# Altium footprint library Connectors SMD.PcbLib: 130 footprints (part 5 of 12)
Each footprint in its own frame and in the unit in brackets; x right, y up, seen from the top. Pads: shape width x height; smd on the part's side, far side on the other; paste and mask are expansions set on the pad; w line width, h text height; cw(c..) or ccw(c..) is an arc to the next point about the centre after c.
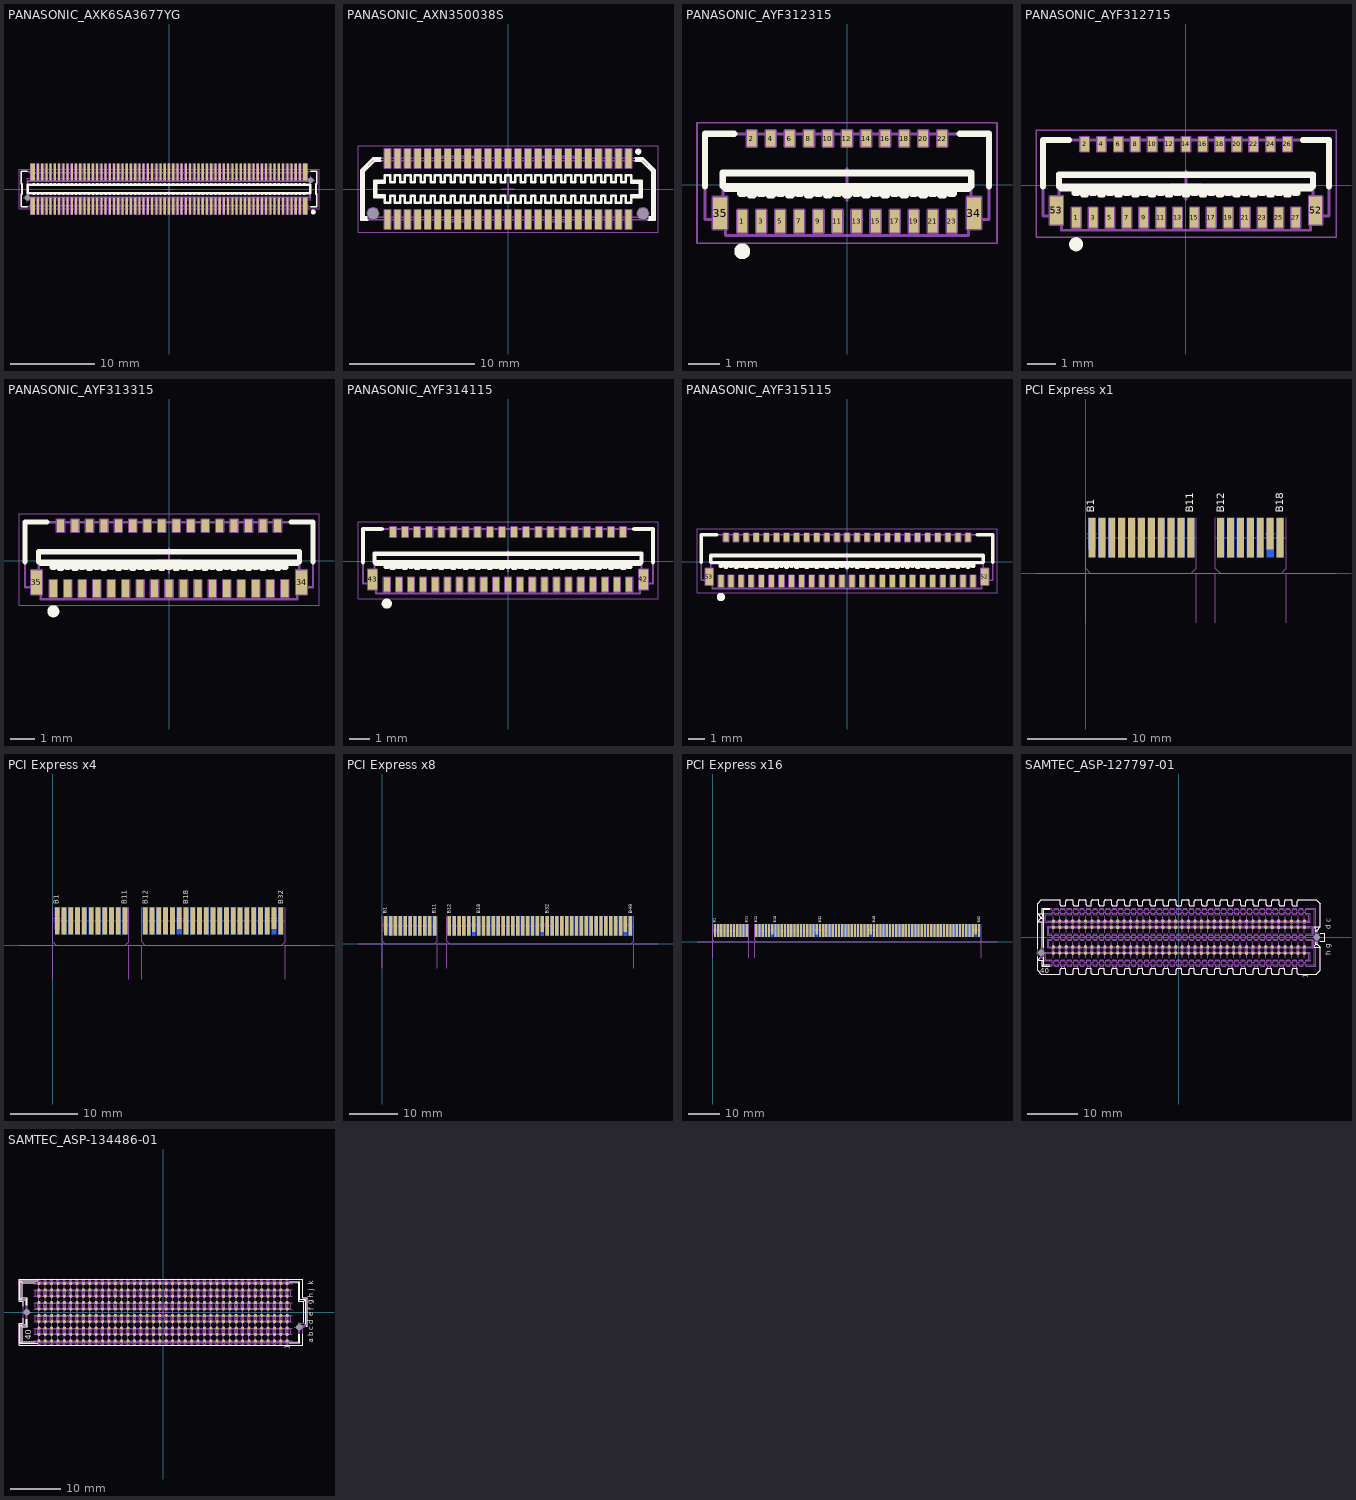
[diagram p4: the footprints below, top view; thin cyan lines are the x and y axes]

## PANASONIC_AXK6SA3677YG [mm] "130 Contacts, Narrow-Pitch 0.5mm, Surface Mount, Straight Board Stacking Header, AXK6S Serie"
height 5.3
pads (132):
  rect 0.5x2 smd: 1(16.125,-2) 2(16.125,2) 129(-16.125,-2) 130(-16.125,2)
  rect 0.25x2 smd: 3(15.5,-2) 4(15.5,2) 5(15,-2) 6(15,2) 7(14.5,-2) 8(14.5,2) 9(14,-2) 10(14,2) 11(13.5,-2) 12(13.5,2) 13(13,-2) 14(13,2) 15(12.5,-2) 16(12.5,2) 17(12,-2) 18(12,2) 19(11.5,-2) 20(11.5,2) 21(11,-2) 22(11,2) 23(10.5,-2) 24(10.5,2) 25(10,-2) 26(10,2) 27(9.5,-2) 28(9.5,2) 29(9,-2) 30(9,2) 31(8.5,-2) 32(8.5,2) 33(8,-2) 34(8,2) 35(7.5,-2) 36(7.5,2) 37(7,-2) 38(7,2) 39(6.5,-2) 40(6.5,2) 41(6,-2) 42(6,2) 43(5.5,-2) 44(5.5,2) 45(5,-2) 46(5,2) 47(4.5,-2) 48(4.5,2) 49(4,-2) 50(4,2) 51(3.5,-2) 52(3.5,2) 53(3,-2) 54(3,2) 55(2.5,-2) 56(2.5,2) 57(2,-2) 58(2,2) 59(1.5,-2) 60(1.5,2) 61(1,-2) 62(1,2) 63(0.5,-2) 64(0.5,2) 65(0,-2) 66(0,2) 67(-0.5,-2) 68(-0.5,2) 69(-1,-2) 70(-1,2) 71(-1.5,-2) 72(-1.5,2) 73(-2,-2) 74(-2,2) 75(-2.5,-2) 76(-2.5,2) 77(-3,-2) 78(-3,2) 79(-3.5,-2) 80(-3.5,2) 81(-4,-2) 82(-4,2) 83(-4.5,-2) 84(-4.5,2) 85(-5,-2) 86(-5,2) 87(-5.5,-2) 88(-5.5,2) 89(-6,-2) 90(-6,2) 91(-6.5,-2) 92(-6.5,2) 93(-7,-2) 94(-7,2) 95(-7.5,-2) 96(-7.5,2) 97(-8,-2) 98(-8,2) 99(-8.5,-2) 100(-8.5,2) 101(-9,-2) 102(-9,2) 103(-9.5,-2) 104(-9.5,2) 105(-10,-2) 106(-10,2) 107(-10.5,-2) 108(-10.5,2) 109(-11,-2) 110(-11,2) 111(-11.5,-2) 112(-11.5,2) 113(-12,-2) 114(-12,2) 115(-12.5,-2) 116(-12.5,2) 117(-13,-2) 118(-13,2) 119(-13.5,-2) 120(-13.5,2) 121(-14,-2) 122(-14,2) 123(-14.5,-2) 124(-14.5,2) 125(-15,-2) 126(-15,2) 127(-15.5,-2) 128(-15.5,2)
  round 0.5 hole 0.65 unplated mask+0.075: 131(-16.75,-1.05) 132(16.75,1.05)
Top Overlay:
  drawing of 418 lines, arcs and shapes, not listed
Mechanical 8:
  drawing of 794 lines, arcs and shapes, not listed
Mechanical 14:
  drawing of 424 lines, arcs and shapes, not listed
Mechanical 15:
  lines w0.1: -17.75,-2.35 -17.75,2.35 17.75,2.35 17.75,-2.35 -17.75,-2.35
3D body: height 5.3, standoff 0, extent -17.5,-2.5 17.5,2.5

## PANASONIC_AXN350038S [mm] "50 Contacts, Narrow-Pitch 0.8mm, Surface Mount, Straight Board Stacking Connector, Socket P8 Serie"
height 2.2
pads (52):
  rect 0.5x1.53 smd: 1(9.6,2.425) 2(9.6,-2.425) 3(8.8,2.425) 4(8.8,-2.425) 5(8,2.425) 6(8,-2.425) 7(7.2,2.425) 8(7.2,-2.425) 9(6.4,2.425) 10(6.4,-2.425) 11(5.6,2.425) 12(5.6,-2.425) 13(4.8,2.425) 14(4.8,-2.425) 15(4,2.425) 16(4,-2.425) 17(3.2,2.425) 18(3.2,-2.425) 19(2.4,2.425) 20(2.4,-2.425) 21(1.6,2.425) 22(1.6,-2.425) 23(0.8,2.425) 24(0.8,-2.425) 25(0,2.425) 26(0,-2.425) 27(-0.8,2.425) 28(-0.8,-2.425) 29(-1.6,2.425) 30(-1.6,-2.425) 31(-2.4,2.425) 32(-2.4,-2.425) 33(-3.2,2.425) 34(-3.2,-2.425) 35(-4,2.425) 36(-4,-2.425) 37(-4.8,2.425) 38(-4.8,-2.425) 39(-5.6,2.425) 40(-5.6,-2.425) 41(-6.4,2.425) 42(-6.4,-2.425) 43(-7.2,2.425) 44(-7.2,-2.425) 45(-8,2.425) 46(-8,-2.425) 47(-8.8,2.425) 48(-8.8,-2.425) 49(-9.6,2.425) 50(-9.6,-2.425)
  round 0.5 hole 0.9 unplated: 51(10.75,-1.95) 52(-10.75,-1.95)
Top Overlay:
  drawing of 237 lines, arcs and shapes, not listed
Mechanical 8:
  drawing of 414 lines, arcs and shapes, not listed
Mechanical 14:
  drawing of 244 lines, arcs and shapes, not listed
Mechanical 15:
  lines w0.05: -11.95,-3.44 -11.95,3.44 11.95,3.44 11.95,-3.44 -11.95,-3.44
3D body: height 2.2, standoff -0.4, extent -11.7,-2.94 11.7,2.94

## PANASONIC_AYF312315 [mm] "23 Contacts, Pitch 0.3mm, Surface Mount, FPC for FPC Connection, YF31 Serie"
height 0.91
pads (25):
  rect 0.3x0.7 smd: 1(-3.3,-1.15) 3(-2.7,-1.15) 5(-2.1,-1.15) 7(-1.5,-1.15) 9(-0.9,-1.15) 11(-0.3,-1.15) 13(0.3,-1.15) 15(0.9,-1.15) 17(1.5,-1.15) 19(2.1,-1.15) 21(2.7,-1.15) 23(3.3,-1.15)
  rect 0.3x0.5 smd: 2(-3,1.45) 4(-2.4,1.45) 6(-1.8,1.45) 8(-1.2,1.45) 10(-0.6,1.45) 12(0,1.45) 14(0.6,1.45) 16(1.2,1.45) 18(1.8,1.45) 20(2.4,1.45) 22(3,1.45)
  rect 0.45x1 smd: 34(4,-0.9) 35(-4,-0.9)
Top Overlay:
  circle w0.25: c-3.3,-2.1 r0.125
  lines w0.2: -4.475,-0.05 -4.475,1.6 -3.55,1.6 ; -3.91,0.35 3.91,0.35 ; -3.825,-0.05 -3.825,-0.129 -3.36,-0.129 ; -3.36,-0.05 -3.36,-0.283 -3.24,-0.283 -3.24,-0.05 ; -3.24,-0.129 -3.06,-0.129 ; -3.06,-0.05 -3.06,-0.332 -2.94,-0.332 -2.94,-0.05 ; -2.94,-0.129 -2.76,-0.129 ; -2.76,-0.05 -2.76,-0.283 -2.64,-0.283 -2.64,-0.05 ; -2.64,-0.129 -2.46,-0.129 ; -2.46,-0.05 -2.46,-0.332 -2.34,-0.332 -2.34,-0.05 ; -2.34,-0.129 -2.16,-0.129 ; -2.16,-0.05 -2.16,-0.283 -2.04,-0.283 -2.04,-0.05 ; -2.04,-0.129 -1.86,-0.129 ; -1.86,-0.05 -1.86,-0.332 -1.74,-0.332 -1.74,-0.05 ; -1.74,-0.129 -1.56,-0.129 ; -1.56,-0.05 -1.56,-0.283 -1.44,-0.283 -1.44,-0.05 ; -1.44,-0.129 -1.26,-0.129 ; -1.26,-0.05 -1.26,-0.332 -1.14,-0.332 -1.14,-0.05 ; -1.14,-0.129 -0.96,-0.129 ; -0.96,-0.05 -0.96,-0.283 -0.84,-0.283 -0.84,-0.05 ; -0.84,-0.129 -0.66,-0.129 ; -0.66,-0.05 -0.66,-0.332 -0.54,-0.332 -0.54,-0.05 ; -0.54,-0.129 -0.36,-0.129 ; -0.36,-0.05 -0.36,-0.283 -0.24,-0.283 -0.24,-0.05 ; -0.24,-0.129 -0.06,-0.129 ; -0.06,-0.05 -0.06,-0.332 0.06,-0.332 0.06,-0.05 ; 0.06,-0.129 0.24,-0.129 ; 0.24,-0.05 0.24,-0.283 0.36,-0.283 0.36,-0.05 ; 0.36,-0.129 0.54,-0.129 ; 0.54,-0.05 0.54,-0.332 0.66,-0.332 0.66,-0.05 ; 0.66,-0.129 0.84,-0.129 ; 0.84,-0.05 0.84,-0.283 0.96,-0.283 0.96,-0.05 ; 0.96,-0.129 1.14,-0.129 ; 1.14,-0.05 1.14,-0.332 1.26,-0.332 1.26,-0.05 ; 1.26,-0.129 1.44,-0.129 ; 1.44,-0.05 1.44,-0.283 1.56,-0.283 1.56,-0.05 ; 1.56,-0.129 1.74,-0.129 ; 1.74,-0.05 1.74,-0.332 1.86,-0.332 1.86,-0.05 ; 1.86,-0.129 2.04,-0.129 ; 2.04,-0.05 2.04,-0.283 2.16,-0.283 2.16,-0.05 ; 2.16,-0.129 2.34,-0.129 ; 2.34,-0.05 2.34,-0.332 2.46,-0.332 2.46,-0.05 ; 2.46,-0.129 2.64,-0.129 ; 2.64,-0.05 2.64,-0.283 2.76,-0.283 2.76,-0.05 ; 2.76,-0.129 2.94,-0.129 ; 2.94,-0.05 2.94,-0.332 3.06,-0.332 3.06,-0.05 ; 3.06,-0.129 3.24,-0.129 ; 3.24,-0.05 3.24,-0.283 3.36,-0.283 3.36,-0.05 ; 3.36,-0.129 3.825,-0.129 3.825,-0.05 ; 3.55,1.6 4.475,1.6 4.475,-0.05 ; -3.91,-0.05 -3.91,0.38 3.91,0.38 3.91,-0.05 -3.91,-0.05
Mechanical 8:
  lines w0.1: -4,-0.9 -4.225,-0.4 ; -3.3,-1.15 -3.15,-1.5 ; -3,1.45 -3.15,1.2 ; -2.7,-1.15 -2.55,-1.5 ; -2.4,1.45 -2.55,1.2 ; -2.1,-1.15 -1.95,-1.5 ; -1.8,1.45 -1.95,1.2 ; -1.5,-1.15 -1.35,-1.5 ; -1.2,1.45 -1.35,1.2 ; -0.9,-1.15 -0.75,-1.5 ; -0.6,1.45 -0.75,1.2 ; -0.5,0 0,0 ; -0.3,-1.15 -0.15,-1.5 ; 0,-0.5 0,0 ; 0,0.5 0,0 ; 0,1.45 -0.15,1.2 ; 0.3,-1.15 0.45,-1.5 ; 0.5,0 0,0 ; 0.6,1.45 0.45,1.2 ; 0.9,-1.15 1.05,-1.5 ; 1.2,1.45 1.05,1.2 ; 1.5,-1.15 1.65,-1.5 ; 1.8,1.45 1.65,1.2 ; 2.1,-1.15 2.25,-1.5 ; 2.4,1.45 2.25,1.2 ; 2.7,-1.15 2.85,-1.5 ; 3,1.45 2.85,1.2 ; 3.3,-1.15 3.45,-1.5 ; 4,-0.9 3.775,-0.4 ; -4.225,-0.4 -3.775,-0.4 -3.775,-1.4 -4.225,-1.4 -4.225,-0.4 ; -3.15,-1.5 -3.45,-1.5 -3.45,-0.8 -3.15,-0.8 -3.15,-1.5 ; -3.15,1.2 -2.85,1.2 -2.85,1.7 -3.15,1.7 -3.15,1.2 ; -2.55,-1.5 -2.85,-1.5 -2.85,-0.8 -2.55,-0.8 -2.55,-1.5 ; -2.55,1.2 -2.25,1.2 -2.25,1.7 -2.55,1.7 -2.55,1.2 ; -1.95,-1.5 -2.25,-1.5 -2.25,-0.8 -1.95,-0.8 -1.95,-1.5 ; -1.95,1.2 -1.65,1.2 -1.65,1.7 -1.95,1.7 -1.95,1.2 ; -1.35,-1.5 -1.65,-1.5 -1.65,-0.8 -1.35,-0.8 -1.35,-1.5 ; -1.35,1.2 -1.05,1.2 -1.05,1.7 -1.35,1.7 -1.35,1.2 ; -0.75,-1.5 -1.05,-1.5 -1.05,-0.8 -0.75,-0.8 -0.75,-1.5 ; -0.75,1.2 -0.45,1.2 -0.45,1.7 -0.75,1.7 -0.75,1.2 ; -0.15,-1.5 -0.45,-1.5 -0.45,-0.8 -0.15,-0.8 -0.15,-1.5 ; -0.15,1.2 0.15,1.2 0.15,1.7 -0.15,1.7 -0.15,1.2 ; 0.45,-1.5 0.15,-1.5 0.15,-0.8 0.45,-0.8 0.45,-1.5 ; 0.45,1.2 0.75,1.2 0.75,1.7 0.45,1.7 0.45,1.2 ; 1.05,-1.5 0.75,-1.5 0.75,-0.8 1.05,-0.8 1.05,-1.5 ; 1.05,1.2 1.35,1.2 1.35,1.7 1.05,1.7 1.05,1.2 ; 1.65,-1.5 1.35,-1.5 1.35,-0.8 1.65,-0.8 1.65,-1.5 ; 1.65,1.2 1.95,1.2 1.95,1.7 1.65,1.7 1.65,1.2 ; 2.25,-1.5 1.95,-1.5 1.95,-0.8 2.25,-0.8 2.25,-1.5 ; 2.25,1.2 2.55,1.2 2.55,1.7 2.25,1.7 2.25,1.2 ; 2.85,-1.5 2.55,-1.5 2.55,-0.8 2.85,-0.8 2.85,-1.5 ; 2.85,1.2 3.15,1.2 3.15,1.7 2.85,1.7 2.85,1.2 ; 3.45,-1.5 3.15,-1.5 3.15,-0.8 3.45,-0.8 3.45,-1.5 ; 3.775,-0.4 4.225,-0.4 4.225,-1.4 3.775,-1.4 3.775,-0.4
Mechanical 14:
  lines w0.1: -4.125,-1.1 -4.125,-1.15 -3.825,-1.15 -3.825,-1.6 3.825,-1.6 3.825,-1.15 4.125,-1.15 4.125,-1.1 ; -4.075,-1.15 -4.075,-1.25 -3.925,-1.25 -3.925,-1.15 ; -3.91,-1.15 -3.91,-1.17 ; -3.91,-0.151 -3.825,-0.151 -3.825,-0.129 ; -3.91,-0.15 -3.825,-0.15 ; -3.91,-0.13 -3.825,-0.13 ; -3.91,-0.05 3.91,-0.05 ; -3.91,0.35 3.91,0.35 ; -3.825,-1.385 -3.91,-1.3 ; -3.825,-1.3 -3.91,-1.3 ; -3.825,-1.17 -3.91,-1.17 ; -3.825,-0.05 -3.825,-0.129 ; -3.36,-0.129 -3.825,-0.129 ; -3.36,-0.05 -3.36,-0.283 -3.24,-0.283 -3.24,-0.05 ; -3.24,-0.129 -3.06,-0.129 ; -3.06,-0.05 -3.06,-0.332 -2.94,-0.332 -2.94,-0.05 ; -2.94,-0.129 -2.76,-0.129 ; -2.76,-0.05 -2.76,-0.283 -2.64,-0.283 -2.64,-0.05 ; -2.64,-0.129 -2.46,-0.129 ; -2.46,-0.05 -2.46,-0.332 -2.34,-0.332 -2.34,-0.05 ; -2.34,-0.129 -2.16,-0.129 ; -2.16,-0.05 -2.16,-0.283 -2.04,-0.283 -2.04,-0.05 ; -2.04,-0.129 -1.86,-0.129 ; -1.86,-0.05 -1.86,-0.332 -1.74,-0.332 -1.74,-0.05 ; -1.74,-0.129 -1.56,-0.129 ; -1.56,-0.05 -1.56,-0.283 -1.44,-0.283 -1.44,-0.05 ; -1.44,-0.129 -1.26,-0.129 ; -1.26,-0.05 -1.26,-0.332 -1.14,-0.332 -1.14,-0.05 ; -1.14,-0.129 -0.96,-0.129 ; -0.96,-0.05 -0.96,-0.283 -0.84,-0.283 -0.84,-0.05 ; -0.84,-0.129 -0.66,-0.129 ; -0.66,-0.05 -0.66,-0.332 -0.54,-0.332 -0.54,-0.05 ; -0.54,-0.129 -0.36,-0.129 ; -0.36,-0.05 -0.36,-0.283 -0.24,-0.283 -0.24,-0.05 ; -0.24,-0.129 -0.06,-0.129 ; -0.06,-0.05 -0.06,-0.332 0.06,-0.332 0.06,-0.05 ; 0.06,-0.129 0.24,-0.129 ; 0.24,-0.05 0.24,-0.283 0.36,-0.283 0.36,-0.05 ; 0.36,-0.129 0.54,-0.129 ; 0.54,-0.05 0.54,-0.332 0.66,-0.332 0.66,-0.05 ; 0.66,-0.129 0.84,-0.129 ; 0.84,-0.05 0.84,-0.283 0.96,-0.283 0.96,-0.05 ; 0.96,-0.129 1.14,-0.129 ; 1.14,-0.05 1.14,-0.332 1.26,-0.332 1.26,-0.05 ; 1.26,-0.129 1.44,-0.129 ; 1.44,-0.05 1.44,-0.283 1.56,-0.283 1.56,-0.05 ; 1.56,-0.129 1.74,-0.129 ; 1.74,-0.05 1.74,-0.332 1.86,-0.332 1.86,-0.05 ; 1.86,-0.129 2.04,-0.129 ; 2.04,-0.05 2.04,-0.283 2.16,-0.283 2.16,-0.05 ; 2.16,-0.129 2.34,-0.129 ; 2.34,-0.05 2.34,-0.332 2.46,-0.332 2.46,-0.05 ; 2.46,-0.129 2.64,-0.129 ; 2.64,-0.05 2.64,-0.283 2.76,-0.283 2.76,-0.05 ; 2.76,-0.129 2.94,-0.129 ; 2.94,-0.05 2.94,-0.332 3.06,-0.332 3.06,-0.05 ; 3.06,-0.129 3.24,-0.129 ; 3.24,-0.05 3.24,-0.283 3.36,-0.283 3.36,-0.05 ; 3.36,-0.129 3.825,-0.129 ; 3.825,-1.385 3.91,-1.3 ; 3.825,-1.3 3.91,-1.3 ; 3.825,-1.17 3.91,-1.17 ; 3.825,-0.15 3.91,-0.15 ; 3.825,-0.13 3.91,-0.13 ; 3.825,-0.05 3.825,-0.129 ; 3.91,-1.15 3.91,-1.17 ; 3.91,-0.151 3.825,-0.151 3.825,-0.129 ; 3.925,-1.15 3.925,-1.25 4.075,-1.25 4.075,-1.15 ; -3.91,-1.3 -3.91,-1.17 ; 3.91,-1.3 3.91,-1.17 ; -4.475,-1.1 -3.91,-1.1 -3.91,0.38 3.91,0.38 3.91,-1.1 4.475,-1.1 4.475,1.6 -4.475,1.6 -4.475,-1.1
Mechanical 15:
  lines w0.05: -4.725,-1.85 4.725,-1.85 4.725,1.95 -4.725,1.95 -4.725,-1.85
3D body: height 0.9, standoff 0, extent -4.475,-1.6 4.475,1.6

## PANASONIC_AYF312715 [mm] "27 Contacts, Pitch 0.3mm, Surface Mount, FPC for FPC Connection, YF31 Serie"
height 0.91
pads (29):
  rect 0.3x0.7 smd: 1(-3.9,-1.15) 3(-3.3,-1.15) 5(-2.7,-1.15) 7(-2.1,-1.15) 9(-1.5,-1.15) 11(-0.9,-1.15) 13(-0.3,-1.15) 15(0.3,-1.15) 17(0.9,-1.15) 19(1.5,-1.15) 21(2.1,-1.15) 23(2.7,-1.15) 25(3.3,-1.15) 27(3.9,-1.15)
  rect 0.3x0.5 smd: 2(-3.6,1.45) 4(-3,1.45) 6(-2.4,1.45) 8(-1.8,1.45) 10(-1.2,1.45) 12(-0.6,1.45) 14(0,1.45) 16(0.6,1.45) 18(1.2,1.45) 20(1.8,1.45) 22(2.4,1.45) 24(3,1.45) 26(3.6,1.45)
  rect 0.45x1 smd: 52(4.6,-0.9) 53(-4.6,-0.9)
Top Overlay:
  circle w0.25: c-3.9,-2.1 r0.125
  lines w0.2: -5.075,-0.05 -5.075,1.6 -4.15,1.6 ; -4.51,0.35 4.51,0.35 ; -4.425,-0.05 -4.425,-0.129 -3.96,-0.129 ; -3.96,-0.05 -3.96,-0.283 -3.84,-0.283 -3.84,-0.05 ; -3.84,-0.129 -3.66,-0.129 ; -3.66,-0.05 -3.66,-0.332 -3.54,-0.332 -3.54,-0.05 ; -3.36,-0.05 -3.36,-0.283 -3.24,-0.283 -3.24,-0.05 ; -3.24,-0.129 -3.06,-0.129 -3.225,-0.129 ; -3.06,-0.05 -3.06,-0.332 -2.94,-0.332 -2.94,-0.05 ; -2.94,-0.129 -2.76,-0.129 ; -2.76,-0.05 -2.76,-0.283 -2.64,-0.283 -2.64,-0.05 ; -2.64,-0.129 -2.46,-0.129 ; -2.46,-0.05 -2.46,-0.332 -2.34,-0.332 -2.34,-0.05 ; -2.34,-0.129 -2.16,-0.129 ; -2.16,-0.05 -2.16,-0.283 -2.04,-0.283 -2.04,-0.05 ; -2.04,-0.129 -1.86,-0.129 ; -1.86,-0.05 -1.86,-0.332 -1.74,-0.332 -1.74,-0.05 ; -1.74,-0.129 -1.56,-0.129 ; -1.56,-0.05 -1.56,-0.283 -1.44,-0.283 -1.44,-0.05 ; -1.44,-0.129 -1.26,-0.129 ; -1.26,-0.05 -1.26,-0.332 -1.14,-0.332 -1.14,-0.05 ; -1.14,-0.129 -0.96,-0.129 ; -0.96,-0.05 -0.96,-0.283 -0.84,-0.283 -0.84,-0.05 ; -0.84,-0.129 -0.66,-0.129 ; -0.66,-0.05 -0.66,-0.332 -0.54,-0.332 -0.54,-0.05 ; -0.54,-0.129 -0.36,-0.129 ; -0.36,-0.05 -0.36,-0.283 -0.24,-0.283 -0.24,-0.05 ; -0.24,-0.129 -0.06,-0.129 ; -0.06,-0.05 -0.06,-0.332 0.06,-0.332 0.06,-0.05 ; 0.06,-0.129 0.24,-0.129 ; 0.24,-0.05 0.24,-0.283 0.36,-0.283 0.36,-0.05 ; 0.36,-0.129 0.54,-0.129 ; 0.54,-0.05 0.54,-0.332 0.66,-0.332 0.66,-0.05 ; 0.66,-0.129 0.84,-0.129 ; 0.84,-0.05 0.84,-0.283 0.96,-0.283 0.96,-0.05 ; 0.96,-0.129 1.14,-0.129 ; 1.14,-0.05 1.14,-0.332 1.26,-0.332 1.26,-0.05 ; 1.26,-0.129 1.44,-0.129 ; 1.44,-0.05 1.44,-0.283 1.56,-0.283 1.56,-0.05 ; 1.56,-0.129 1.74,-0.129 ; 1.74,-0.05 1.74,-0.332 1.86,-0.332 1.86,-0.05 ; 1.86,-0.129 2.04,-0.129 ; 2.04,-0.05 2.04,-0.283 2.16,-0.283 2.16,-0.05 ; 2.16,-0.129 2.34,-0.129 ; 2.34,-0.05 2.34,-0.332 2.46,-0.332 2.46,-0.05 ; 2.46,-0.129 2.64,-0.129 ; 2.64,-0.05 2.64,-0.283 2.76,-0.283 2.76,-0.05 ; 2.76,-0.129 2.94,-0.129 ; 2.94,-0.05 2.94,-0.332 3.06,-0.332 3.06,-0.05 ; 3.06,-0.129 3.24,-0.129 ; 3.24,-0.05 3.24,-0.283 3.36,-0.283 3.36,-0.05 ; 3.36,-0.129 3.54,-0.129 ; 3.54,-0.05 3.54,-0.332 3.66,-0.332 3.66,-0.05 ; 3.66,-0.129 3.84,-0.129 ; 3.84,-0.05 3.84,-0.283 3.96,-0.283 3.96,-0.05 ; 3.96,-0.129 4.425,-0.129 4.425,-0.05 ; 4.15,1.6 5.075,1.6 5.075,-0.05 ; -4.51,-0.05 4.51,-0.05 4.51,0.38 -4.51,0.38 -4.51,-0.05
Mechanical 8:
  drawing of 151 lines, arcs and shapes, not listed
Mechanical 14:
  drawing of 154 lines, arcs and shapes, not listed
Mechanical 15:
  lines w0.05: -5.325,-1.85 -5.325,1.95 5.325,1.95 5.325,-1.85 -5.325,-1.85
3D body: height 0.9, standoff 0, extent -5.075,-1.6 5.075,1.6

## PANASONIC_AYF313315 [mm] "33 Contacts, Pitch 0.3mm, Surface Mount, FPC for FPC Connection, YF31 Serie"
height 0.91
pads (35):
  rect 0.3x0.7 smd: 1(-4.8,-1.15) 3(-4.2,-1.15) 5(-3.6,-1.15) 7(-3,-1.15) 9(-2.4,-1.15) 11(-1.8,-1.15) 13(-1.2,-1.15) 15(-0.6,-1.15) 17(0,-1.15) 19(0.6,-1.15) 21(1.2,-1.15) 23(1.8,-1.15) 25(2.4,-1.15) 27(3,-1.15) 29(3.6,-1.15) 31(4.2,-1.15) 33(4.8,-1.15)
  rect 0.3x0.5 smd: 2(-4.5,1.45) 4(-3.9,1.45) 6(-3.3,1.45) 8(-2.7,1.45) 10(-2.1,1.45) 12(-1.5,1.45) 14(-0.9,1.45) 16(-0.3,1.45) 18(0.3,1.45) 20(0.9,1.45) 22(1.5,1.45) 24(2.1,1.45) 26(2.7,1.45) 28(3.3,1.45) 30(3.9,1.45) 32(4.5,1.45)
  rect 0.45x1 smd: 34(5.5,-0.9) 35(-5.5,-0.9)
Top Overlay:
  circle w0.25: c-4.8,-2.1 r0.125
  lines w0.2: -5.975,-0.05 -5.975,1.6 -5.05,1.6 ; -5.41,0.35 5.41,0.35 ; -5.325,-0.05 -5.325,-0.129 -4.86,-0.129 ; -4.86,-0.05 -4.86,-0.283 -4.74,-0.283 -4.74,-0.05 ; -4.74,-0.129 -4.56,-0.129 ; -4.56,-0.05 -4.56,-0.332 -4.44,-0.332 -4.44,-0.05 ; -4.44,-0.129 -4.26,-0.129 ; -4.26,-0.05 -4.26,-0.283 -4.14,-0.283 -4.14,-0.05 ; -4.14,-0.129 -3.96,-0.129 ; -3.96,-0.05 -3.96,-0.332 -3.84,-0.332 -3.84,-0.05 ; -3.84,-0.129 -3.66,-0.129 ; -3.66,-0.05 -3.66,-0.283 -3.54,-0.283 -3.54,-0.05 ; -3.54,-0.129 -3.36,-0.129 ; -3.36,-0.05 -3.36,-0.332 -3.24,-0.332 -3.24,-0.05 ; -3.24,-0.129 -3.06,-0.129 ; -3.06,-0.05 -3.06,-0.283 -2.94,-0.283 -2.94,-0.05 ; -2.94,-0.129 -2.76,-0.129 ; -2.76,-0.05 -2.76,-0.332 -2.64,-0.332 -2.64,-0.05 ; -2.64,-0.129 -2.46,-0.129 ; -2.46,-0.05 -2.46,-0.283 -2.34,-0.283 -2.34,-0.05 ; -2.34,-0.129 -2.16,-0.129 ; -2.16,-0.05 -2.16,-0.332 -2.04,-0.332 -2.04,-0.05 ; -2.04,-0.129 -1.86,-0.129 ; -1.86,-0.05 -1.86,-0.283 -1.74,-0.283 -1.74,-0.05 ; -1.74,-0.129 -1.56,-0.129 ; -1.56,-0.05 -1.56,-0.332 -1.44,-0.332 -1.44,-0.05 ; -1.44,-0.129 -1.26,-0.129 ; -1.26,-0.05 -1.26,-0.283 -1.14,-0.283 -1.14,-0.05 ; -1.14,-0.129 -0.96,-0.129 ; -0.96,-0.05 -0.96,-0.332 -0.84,-0.332 -0.84,-0.05 ; -0.84,-0.129 -0.66,-0.129 ; -0.66,-0.05 -0.66,-0.283 -0.54,-0.283 -0.54,-0.05 ; -0.54,-0.129 -0.36,-0.129 ; -0.36,-0.05 -0.36,-0.332 -0.24,-0.332 -0.24,-0.05 ; -0.24,-0.129 -0.06,-0.129 ; -0.06,-0.05 -0.06,-0.283 0.06,-0.283 0.06,-0.05 ; 0.06,-0.129 0.24,-0.129 ; 0.24,-0.05 0.24,-0.332 0.36,-0.332 0.36,-0.05 ; 0.36,-0.129 0.54,-0.129 ; 0.54,-0.05 0.54,-0.283 0.66,-0.283 0.66,-0.05 ; 0.66,-0.129 0.84,-0.129 ; 0.84,-0.05 0.84,-0.332 0.96,-0.332 0.96,-0.05 ; 0.96,-0.129 1.14,-0.129 ; 1.14,-0.05 1.14,-0.283 1.26,-0.283 1.26,-0.05 ; 1.26,-0.129 1.44,-0.129 ; 1.44,-0.05 1.44,-0.332 1.56,-0.332 1.56,-0.05 ; 1.56,-0.129 1.74,-0.129 ; 1.74,-0.05 1.74,-0.283 1.86,-0.283 1.86,-0.05 ; 1.86,-0.129 2.04,-0.129 ; 2.04,-0.05 2.04,-0.332 2.16,-0.332 2.16,-0.05 ; 2.16,-0.129 2.34,-0.129 ; 2.34,-0.05 2.34,-0.283 2.46,-0.283 2.46,-0.05 ; 2.46,-0.129 2.64,-0.129 ; 2.64,-0.05 2.64,-0.332 2.76,-0.332 2.76,-0.05 ; 2.76,-0.129 2.94,-0.129 ; 2.94,-0.05 2.94,-0.283 3.06,-0.283 3.06,-0.05 ; 3.06,-0.129 3.24,-0.129 ; 3.24,-0.05 3.24,-0.332 3.36,-0.332 3.36,-0.05 ; 3.36,-0.129 3.54,-0.129 ; 3.54,-0.05 3.54,-0.283 3.66,-0.283 3.66,-0.05 ; 3.66,-0.129 3.84,-0.129 ; 3.84,-0.05 3.84,-0.332 3.96,-0.332 3.96,-0.05 ; 3.96,-0.129 4.14,-0.129 ; 4.14,-0.05 4.14,-0.283 4.26,-0.283 4.26,-0.05 ; 4.26,-0.129 4.44,-0.129 ; 4.44,-0.05 4.44,-0.332 4.56,-0.332 4.56,-0.05 ; 4.56,-0.129 4.74,-0.129 ; 4.74,-0.05 4.74,-0.283 4.86,-0.283 4.86,-0.05 ; 4.86,-0.129 5.325,-0.129 5.325,-0.05 ; 5.05,1.6 5.975,1.6 5.975,-0.05 ; -5.41,-0.05 5.41,-0.05 5.41,0.38 -5.41,0.38 -5.41,-0.05
Mechanical 8:
  drawing of 179 lines, arcs and shapes, not listed
Mechanical 14:
  drawing of 176 lines, arcs and shapes, not listed
Mechanical 15:
  lines w0.05: -6.225,-1.85 -6.225,1.95 6.225,1.95 6.225,-1.85 -6.225,-1.85
3D body: height 0.9, standoff 0, extent -5.975,-1.6 5.975,1.6

## PANASONIC_AYF314115 [mm] "41 Contacts, Pitch 0.3mm, Surface Mount, FPC for FPC Connection, YF31 Serie"
height 0.91
pads (43):
  rect 0.3x0.7 smd: 1(-6,-1.15) 3(-5.4,-1.15) 5(-4.8,-1.15) 7(-4.2,-1.15) 9(-3.6,-1.15) 11(-3,-1.15) 13(-2.4,-1.15) 15(-1.8,-1.15) 17(-1.2,-1.15) 19(-0.6,-1.15) 21(0,-1.15) 23(0.6,-1.15) 25(1.2,-1.15) 27(1.8,-1.15) 29(2.4,-1.15) 31(3,-1.15) 33(3.6,-1.15) 35(4.2,-1.15) 37(4.8,-1.15) 39(5.4,-1.15) 41(6,-1.15)
  rect 0.3x0.5 smd: 2(-5.7,1.45) 4(-5.1,1.45) 6(-4.5,1.45) 8(-3.9,1.45) 10(-3.3,1.45) 12(-2.7,1.45) 14(-2.1,1.45) 16(-1.5,1.45) 18(-0.9,1.45) 20(-0.3,1.45) 22(0.3,1.45) 24(0.9,1.45) 26(1.5,1.45) 28(2.1,1.45) 30(2.7,1.45) 32(3.3,1.45) 34(3.9,1.45) 36(4.5,1.45) 38(5.1,1.45) 40(5.7,1.45)
  rect 0.45x1 smd: 42(6.7,-0.9) 43(-6.7,-0.9)
Top Overlay:
  drawing of 177 lines, arcs and shapes, not listed
Mechanical 8:
  drawing of 219 lines, arcs and shapes, not listed
Mechanical 14:
  drawing of 210 lines, arcs and shapes, not listed
Mechanical 15:
  lines w0.05: -7.425,-1.85 7.425,-1.85 7.425,1.95 -7.425,1.95 -7.425,-1.85
3D body: height 0.9, standoff 0, extent -7.175,-1.6 7.175,1.6
